# Altium footprint library PCB_LIB.PcbLib: 18 footprints (part 2 of 2)
Each footprint in its own frame and in the unit in brackets; x right, y up, seen from the top. Pads: shape width x height; smd on the part's side, far side on the other; paste and mask are expansions set on the pad; w line width, h text height; cw(c..) or ccw(c..) is an arc to the next point about the centre after c.
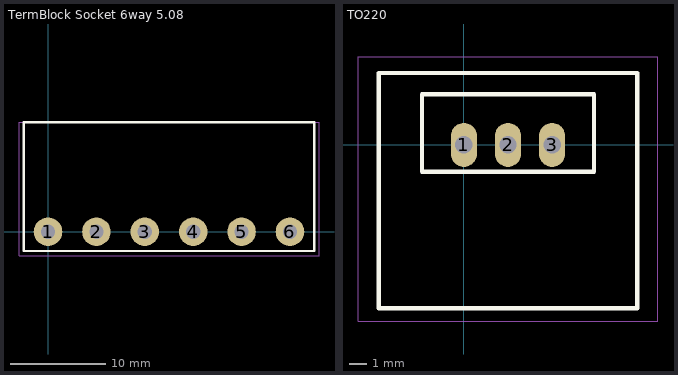
[diagram p1: the footprints below, top view; thin cyan lines are the x and y axes]

## TermBlock Socket 6way 5.08 [mm] "TermBlock Socket 90d 2wall 6way 5.08"
pads (6):
  round 3 hole 1.5: 1(0,0) 2(5.08,0) 3(10.16,0) 4(15.24,0) 5(20.32,0) 6(25.4,0)
Top Overlay:
  lines w0.254: -2.54,-2.032 -2.54,11.5 27.94,11.5 27.94,-2.032 -2.54,-2.032
Mechanical 14:
  lines w0.051: -3.048,-2.54 -3.048,11.5 28.448,11.5 28.448,-2.54 -3.048,-2.54
3D body: height 8.5, standoff -3.49, extent -2.54,-1.992 27.94,10.008

## TO220 [mm]
pads (3):
  oval 1.5x2.54 hole 1: 1(0,0) 2(2.54,0) 3(5.08,0)
Top Overlay:
  lines w0.254: -4.901,-9.396 9.981,-9.396 9.981,4.14 -4.901,4.14 -4.901,-9.396 ; -2.41,-1.55 -2.41,2.907 7.49,2.907 7.49,-1.55 -2.41,-1.55
Mechanical 14:
  lines w0.051: -6.096,-10.16 11.176,-10.16 11.176,5.08 -6.096,5.08 -6.096,-10.16
3D body: height 21.52, standoff 2.47, extent -4.901,-9.396 9.981,4.14
3D body: height 18.69, standoff -4.8, extent -2.41,-1.55 7.49,2.907